# Altium footprint library LUMI_Standard_Auto_Soldering_LIB.PcbLib: 344 footprints (part 6 of 22)
Each footprint in its own frame and in the unit in brackets; x right, y up, seen from the top. Pads: shape width x height; smd on the part's side, far side on the other; paste and mask are expansions set on the pad; w line width, h text height; cw(c..) or ccw(c..) is an arc to the next point about the centre after c.
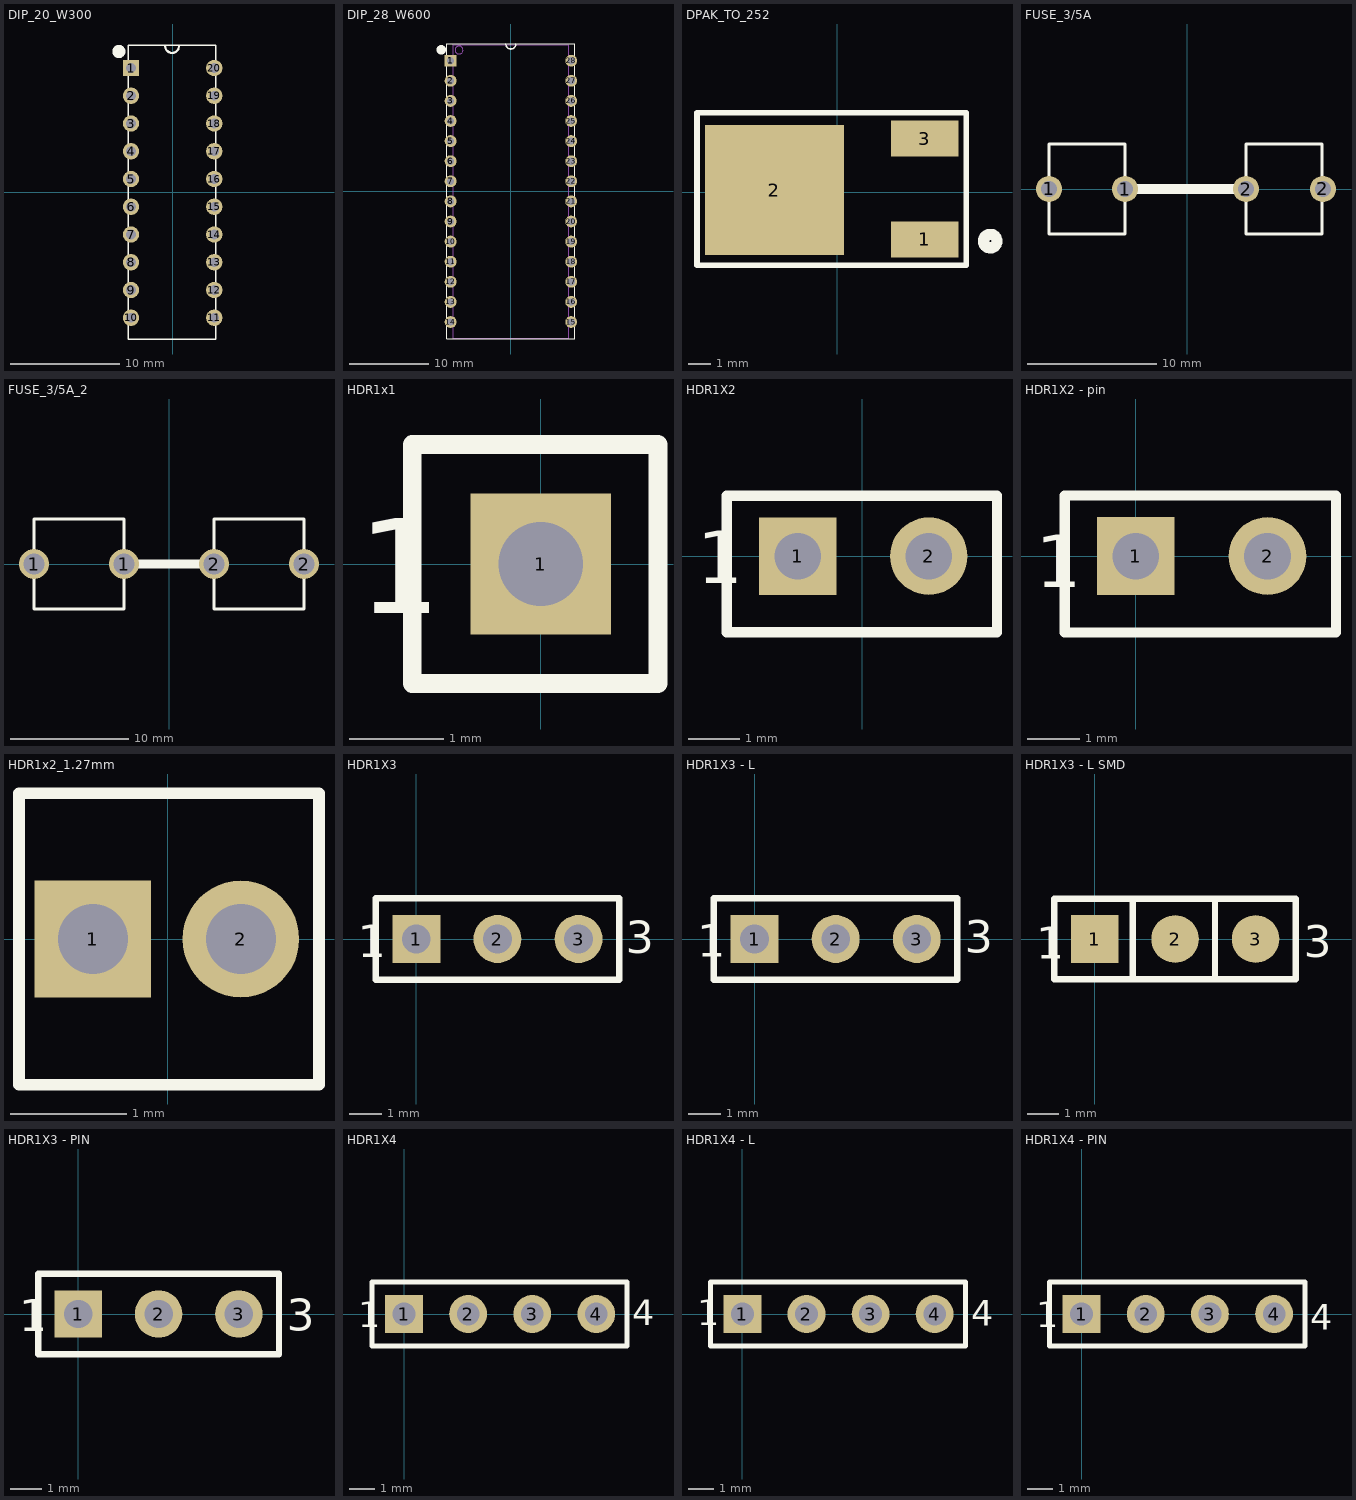
[diagram p5: the footprints below, top view; thin cyan lines are the x and y axes]

## DIP_20_W300 [mm] "DIP, 40-Leads, Row Spacing 15.24mm, Pitch 2.54mm, Body 51.8x13.5mm"
height 6.35
pads (20):
  rect 1.5x1.5 hole 0.9: 1(-3.81,11.36)
  round 1.5 hole 0.9: 2(-3.81,8.82) 3(-3.81,6.28) 4(-3.81,3.74) 5(-3.81,1.2) 6(-3.81,-1.34) 7(-3.81,-3.88) 8(-3.81,-6.42) 9(-3.81,-8.96) 10(-3.81,-11.5) 11(3.81,-11.5) 12(3.81,-8.96) 13(3.81,-6.42) 14(3.81,-3.88) 15(3.81,-1.34) 16(3.81,1.2) 17(3.81,3.74) 18(3.81,6.28) 19(3.81,8.82) 20(3.81,11.36)
Top Overlay:
  circle w0.6: c-4.925,12.875 r0.3
  lines w0.127: -4.05,-13.445 3.95,-13.445 3.95,13.46 -4.05,13.46 -4.05,-13.445
  lines w0.2: -0.685,13.383 ccw(c-0.05,13.383) 0.585,13.383
3D body: height 4.65, standoff -1.57, extent -3.962,-12.89 3.912,12.891

## DIP_28_W600 [mm] "DIP, 40-Leads, Row Spacing 15.24mm, Pitch 2.54mm, Body 51.8x13.5mm"
height 6.35
pads (28):
  rect 1.5x1.5 hole 0.9: 1(-7.62,16.497)
  round 1.5 hole 0.9: 2(-7.62,13.957) 3(-7.62,11.417) 4(-7.62,8.877) 5(-7.62,6.337) 6(-7.62,3.797) 7(-7.62,1.257) 8(-7.62,-1.283) 9(-7.62,-3.823) 10(-7.62,-6.363) 11(-7.62,-8.903) 12(-7.62,-11.443) 13(-7.62,-13.983) 14(-7.62,-16.523) 15(7.62,-16.523) 16(7.62,-13.983) 17(7.62,-11.443) 18(7.62,-8.903) 19(7.62,-6.363) 20(7.62,-3.823) 21(7.62,-1.283) 22(7.62,1.257) 23(7.62,3.797) 24(7.62,6.337) 25(7.62,8.877) 26(7.62,11.417) 27(7.62,13.957) 28(7.62,16.497)
Top Overlay:
  circle w0.25: c-8.725,17.95 r0.125
  circle w0.6: c-8.8,17.875 r0.3
  lines w0.127: -8.1,-18.67 8.1,-18.67 8.1,18.67 -8.1,18.67 -8.1,-18.67
  lines w0.2: -0.635,18.604 ccw(c0,18.604) 0.635,18.604
Mechanical 13:
  circle w0.1: c-6.545,17.843 r0.5
  lines w0.1: -7.3,-18.555 -7.3,18.504 7.3,18.504 7.3,-18.555 -7.3,-18.555
3D body: height 5.79, standoff -3.3, extent -7.618,-18.835 7.618,18.505

## DPAK_TO_252 [mm]
pads (3):
  rect 3x1.6 smd: 1(3.9,-2.1) 3(3.9,2.4)
  rect 6.2x5.8 smd: 2(-2.8,0.1)
Top Overlay:
  circle w0.5: c6.825,-2.175 r0.302
  lines w0.254: -6.25,-3.25 -6.25,3.55 5.75,3.55 5.75,-3.25 -6.25,-3.25
3D body: height 2.3, standoff -0.01, extent -4.75,-3.2 4.95,3.38

## FUSE_3/5A [mil]
pads (4):
  round 80 hole 50: 1(-422.44,0) 1(-190,0) 2(180,0) 2(415.28,0)
Top Overlay:
  lines w10: -422.44,-137.8 -190,-137.8 -190,137.8 -422.44,137.8 -422.44,-137.79 ; 180,-137.8 180,137.8 412.44,137.79 412.44,-137.8 180,-137.8
  lines w30: -170,0 200,0
3D body: height 375.66, standoff -132.16, extent -422.44,-121.85 415.28,121.86

## FUSE_3/5A_2 [mil]
pads (4):
  round 100 hole 70: 1(-450,0) 1(-150,0) 2(150,0) 2(450,0)
Top Overlay:
  lines w10: -450,-150 -450,150 -150,150 -150,-150 -450,-150 ; 150,-150 150,150 450,150 450,-150 150,-150
  lines w30: -100,0 100,0
3D body: height 448.43, standoff 251.57, extent -393.69,-98.42 393.71,98.43
3D body: height 431.53, standoff -136.22, extent 189.69,-151.63 410.32,151.64
3D body: height 477.88, standoff -29.94, extent -419.99,-121.85 -179.99,121.86

## HDR1x1 [mm]
pads (1):
  rect 1.5x1.5 hole 0.9: 1(0,0)
Top Overlay:
  lines w0.2: -1.372,-1.275 1.25,-1.275 1.25,1.275 -1.372,1.275 -1.372,-1.275
  text "1" at -1.95,-0.525 h1.02

## HDR1X2 [mm] "Connector; Header; 2 Position"
pads (2):
  rect 1.5x1.5 hole 0.9: 1(-1.25,0)
  round 1.5 hole 0.9: 2(1.29,0)
Top Overlay:
  lines w0.2: -2.622,-1.473 -2.622,1.168 2.611,1.168 2.611,-1.473 -2.622,-1.473
  text "1" at -3.2,-0.525 h1.02
3D body: height 8.55, standoff -2.43, extent -2.56,-1.263 2.52,1.277

## HDR1X2 - pin [mm] "Connector; Header; 2 Position"
pads (2):
  rect 1.5x1.5 hole 0.9: 1(0,0)
  round 1.5 hole 0.9: 2(2.54,0)
Top Overlay:
  lines w0.2: -1.372,-1.473 3.861,-1.473 3.861,1.168 -1.372,1.168 -1.372,-1.473
  text "1" at -1.925,-0.6 h1.02
3D body: height 6.02, standoff -3.1, extent -1.27,-1.295 3.81,1.245

## HDR1x2_1.27mm [mm]
pads (2):
  rect 1x1 hole 0.6 mask+0.07: 1(-0.64,0)
  round 1 hole 0.6 mask+0.07: 2(0.63,0)
Top Overlay:
  lines w0.1: -1.275,-1.25 -1.275,1.25 1.3,1.25 1.3,-1.25 -1.275,-1.25

## HDR1X3 [mm] "Connector; Header; 3 Position"
pads (3):
  rect 1.5x1.5 hole 0.9: 1(0,0)
  round 1.5 hole 0.9: 2(2.54,0) 3(5.08,0)
Top Overlay:
  lines w0.2: -1.27,-1.27 -1.27,1.27 6.35,1.27 6.35,-1.27 -1.27,-1.27
  text "3" at 6.55,-0.45 h1.02
  text "1" at -1.825,-0.575 h1.02

## HDR1X3 - L [mm] "Connector; Header; 3 Position"
pads (3):
  rect 1.5x1.5 hole 0.9: 1(0,0)
  round 1.5 hole 0.9: 2(2.54,0) 3(5.08,0)
Top Overlay:
  lines w0.2: -1.27,-1.27 -1.27,1.27 6.35,1.27 6.35,-1.27 -1.27,-1.27
  text "3" at 6.575,-0.425 h1.02
  text "1" at -1.8,-0.55 h1.02
3D body: height 4.33, standoff -3, extent -1.27,-1.27 6.35,7

## HDR1X3 - L SMD [mm]
pads (3):
  rect 1.5x1.5 smd: 1(0,0)
  round 1.5 smd: 2(2.54,0) 3(5.08,0)
Top Overlay:
  lines w0.2: 1.2,-1.27 1.2,1.27 ; 3.8,-1.27 3.8,1.27 ; -1.27,-1.27 -1.27,1.27 6.35,1.27 6.35,-1.27 -1.27,-1.27
  text "1" at -1.85,-0.625 h1.02
  text "3" at 6.6,-0.575 h1.02
3D body: height 2.77, standoff -5.5, extent -1.31,-0.525 6.31,6.8

## HDR1X3 - PIN [mm] "Connector; Header; 3 Position"
pads (3):
  rect 1.5x1.5 hole 0.9: 1(0,0)
  round 1.5 hole 0.9: 2(2.54,0) 3(5.08,0)
Top Overlay:
  lines w0.2: -1.27,-1.27 6.35,-1.27 6.35,1.27 -1.27,1.27 -1.27,-1.27
  text "3" at 6.6,-0.525 h1.02
  text "1" at -1.875,-0.55 h1.02
3D body: height 6.02, standoff -3.1, extent -1.27,-1.245 6.35,1.295

## HDR1X4 [mm] "Connector; Header; 4 Position"
pads (4):
  rect 1.5x1.5 hole 0.9: 1(0,0)
  round 1.5 hole 0.9: 2(2.54,0) 3(5.08,0) 4(7.62,0)
Top Overlay:
  lines w0.2: -1.27,-1.27 -1.27,1.27 8.839,1.27 8.839,-1.27 -1.27,-1.27
  text "4" at 9.05,-0.45 h1.02
  text "1" at -1.825,-0.525 h1.02
3D body: height 8.55, standoff -2.43, extent 3.632,-1.245 8.712,1.295
3D body: height 8.55, standoff -2.43, extent -1.219,-1.245 3.861,1.295

## HDR1X4 - L [mm] "Connector; Header; 4 Position"
pads (4):
  rect 1.5x1.5 hole 0.9: 1(0,0)
  round 1.5 hole 0.9: 2(2.54,0) 3(5.08,0) 4(7.62,0)
Top Overlay:
  lines w0.2: -1.27,-1.27 8.839,-1.27 8.839,1.27 -1.27,1.27 -1.27,-1.27
  text "1" at -1.8,-0.45 h1.02
  text "4" at 9.075,-0.475 h1.02
3D body: height 4.33, standoff -3, extent -1.295,-7 8.865,1.27

## HDR1X4 - PIN [mm] "Connector; Header; 4 Position"
pads (4):
  rect 1.5x1.5 hole 0.9: 1(0,0)
  round 1.5 hole 0.9: 2(2.54,0) 3(5.08,0) 4(7.62,0)
Top Overlay:
  lines w0.2: -1.27,-1.27 -1.27,1.27 8.839,1.27 8.839,-1.27 -1.27,-1.27
  text "4" at 9.05,-0.625 h1.02
  text "1" at -1.8,-0.525 h1.02
3D body: height 6.02, standoff -3.1, extent -1.27,-1.295 8.89,1.245